# Altium footprint library Toi Library.PcbLib: 740 footprints (part 27 of 47)
Each footprint in its own frame and in the unit in brackets; x right, y up, seen from the top. Pads: shape width x height; smd on the part's side, far side on the other; paste and mask are expansions set on the pad; w line width, h text height; cw(c..) or ccw(c..) is an arc to the next point about the centre after c.
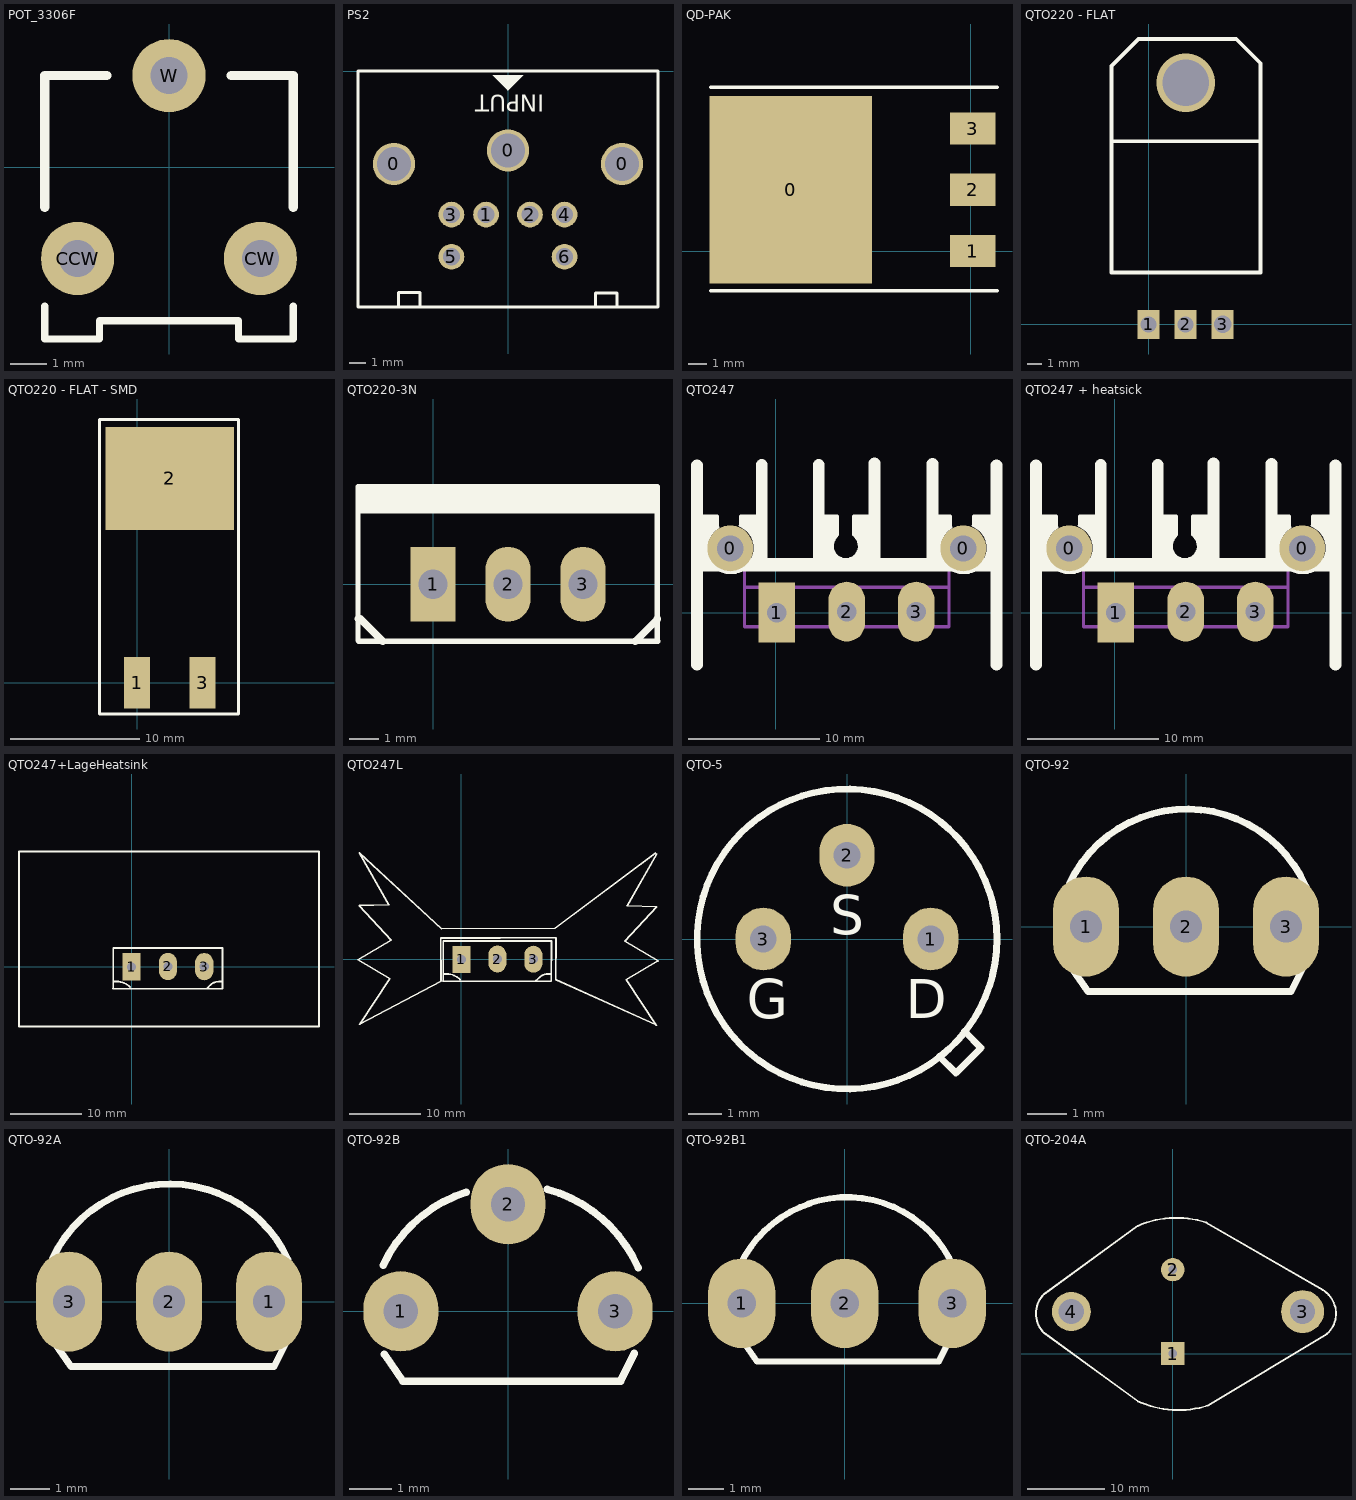
[diagram p26: the footprints below, top view; thin cyan lines are the x and y axes]

## POT_3306F [mm]
pads (3):
  round 2 hole 1.016: CCW(-2.5,-2.5) CW(2.5,-2.5) W(0,2.5)
Top Overlay:
  lines w0.2: -3.4,-3.8 -3.4,-4.7 -1.9,-4.7 -1.9,-4.2 0,-4.2 1.9,-4.2 1.9,-4.7 3.4,-4.7 3.4,-3.8
  lines w0.254: -3.4,-1.1 -3.4,2.5 -1.7,2.5 ; 1.7,2.5 3.4,2.5 3.4,-1.1
3D body "Trimmer, 3306F.step": height 7.62, standoff -3.04, extent -3.405,-4.876 3.405,3.79

## PS2 [mm] "PS2"
height 5.08
pads (9):
  round 2.5 hole 2: 0(-6.76,-5.5) 0(0,-4.7) 0(6.76,-5.5)
  round 1.524 hole 1.016: 1(-1.3,-8.5) 2(1.3,-8.5) 3(-3.35,-8.5) 4(3.35,-8.5) 5(-3.35,-11) 6(3.35,-11)
Top Overlay:
  region: 0.902,-0.254 -0.902,-0.254 -0.013,-1.143 -0.013,-1.168
  lines w0.178: -6.477,-13.894 -6.477,-13.132 -5.207,-13.132 -5.207,-13.894 ; 5.182,-13.919 5.182,-13.157 6.452,-13.157 6.452,-13.919 ; -8.89,-13.97 -8.89,0 8.89,0 8.89,-13.97 -8.89,-13.97
  text "INPUT" at 2.159,-1.397 h1

## QD-PAK [mm] "SMD - D-PAK -For 78xx"
pads (4):
  rect 9x10.41 smd: 0(-10,3.4)
  rect 2.5x1.8 smd: 1(0.102,0) 2(0.102,3.4) 3(0.102,6.8)
Top Overlay:
  lines w0.203: -14.427,-2.21 1.448,-2.21 ; -14.427,9.093 1.448,9.093

## QTO220 - FLAT [mm]
pads (3):
  rect 1.5x2 hole 1.1: 1(0,0) 2(2.54,0)
  rect 1.5x2 hole 1.2: 3(5.08,0)
via 2.54,16.562 diameter 4 hole 3.2
Top Overlay:
  lines w0.254: -2.54,5.861 -2.54,17.71 -0.686,19.564 6.007,19.564 7.671,17.901 7.671,3.562 -2.54,3.562 -2.54,12.554 7.671,12.554
3D body "TO220_NAM.step": height 4.45, standoff -1.79, extent -2.54,-0.19 7.62,19.09

## QTO220 - FLAT - SMD [mm]
pads (3):
  rect 2x4 smd: 1(0,0) 3(5.08,0)
  rect 10x8 smd: 2(2.54,15.875)
Top Overlay:
  lines w0.254: -2.921,-2.413 7.874,-2.413 7.874,20.447 -2.921,20.447 -2.921,-2.413
3D body "TO220_NAM.step": height 4.45, standoff -1.79, extent -2.54,-0.19 7.62,19.09

## QTO220-3N [mil]
pads (3):
  rect 60x100 hole 39: 1(0,0)
  oval 60x100 hole 39: 2(100,0) 3(200,0)
Top Overlay:
  rectangle: -99,94 300,130
  lines w7: 298,107 299,93 ; -100,-75 -100,130 299,130 299,-75 300,-76 -76,-76 -99,-76 -100,-75
  lines w10: -100,-46 -97,-46 -67,-76 ; 270,-76 299,-47 299,-46
3D body "SW3dPS-TO220AB.STEP": height 904.72, standoff -250, extent -119,-64 322.46,120.65

## QTO247 [mil]
pads (5):
  round 137.8 hole 78.74: 0(-136.34,194) 0(563.66,194)
  rect 110x180 hole 59.06: 1(3,1)
  oval 110x180 hole 59.06: 2(213.66,4) 3(422.32,4)
Top Overlay:
  region: 595,290 595,265 615,245 620,245 630,235 630,225 635,220 635,160 660,160 665,165 650,180 650,290
  region: 475,290 525,290 525,255 520,255 500,235 500,225 490,215 490,180 495,175 495,160 475,160
  region: -225,290 -175,290 -175,255 -180,255 -200,235 -200,225 -210,215 -210,180 -205,175 -205,160 -225,160
  region: -105,290 -105,265 -85,245 -80,245 -70,235 -70,225 -65,220 -65,160 -40,160 -35,165 -50,180 -50,290
  region: 140,290 190,290 190,240 170,220 170,180 190,160 140,160
  region: 230,290 290,290 290,150 280,160 230,160 250,180 250,220 230,240
  lines w10: -225,290 -175,290 -175,260 ; -173.69,257.87 ccw(c-135,195) -105.92,262.86 ; -163.31,220 ccw(c-134.15,190.85) -105,220 ; -105,265 -105,290 -55,290 ; 130,290 185,290 185,235 180,230 ; 181.96,229.73 ccw(c210.85,200.85) 239.73,229.73 ; 240,230 235,235 235,290 280,290 ; 475,290 525,290 525,260 ; 526.31,257.87 ccw(c565,195) 594.08,262.86 ; 595,265 595,290 645,290
  lines w35: -236.34,-156 -236.34,444 ; -42,149 -42,445 ; 129,149 129,445 ; 297,148 297,450 ; 471,148 471,448 ; 663.66,-156 663.66,444
  lines w40: -230,145 655,145
Mechanical 1:
  lines w10: -93.43,76.83 520.75,76.83 ; -93.43,-41.28 -93.43,135.89 520.75,135.89 520.75,-41.28 -93.43,-41.28
3D body "User Library-heat sink-1.STEP": height 1355.51, standoff 150, extent -240.79,-200.67 660.79,445
3D body "SW3dPS-TO-247.STEP": height 1060, standoff -360, extent -95,-105 505,75

## QTO247 + heatsick [mil]
pads (5):
  round 137.8 hole 78.74: 0(-136.34,194) 0(563.66,194)
  rect 110x180 hole 59.06: 1(3,1)
  oval 110x180 hole 59.06: 2(213.66,4) 3(422.32,4)
Top Overlay:
  region: 595,290 595,265 615,245 620,245 630,235 630,225 635,220 635,160 660,160 665,165 650,180 650,290
  region: 475,290 525,290 525,255 520,255 500,235 500,225 490,215 490,180 495,175 495,160 475,160
  region: -225,290 -175,290 -175,255 -180,255 -200,235 -200,225 -210,215 -210,180 -205,175 -205,160 -225,160
  region: -105,290 -105,265 -85,245 -80,245 -70,235 -70,225 -65,220 -65,160 -40,160 -35,165 -50,180 -50,290
  region: 140,290 190,290 190,240 170,220 170,180 190,160 140,160
  region: 230,290 290,290 290,150 280,160 230,160 250,180 250,220 230,240
  lines w10: -225,290 -175,290 -175,260 ; -173.69,257.87 ccw(c-135,195) -105.92,262.86 ; -163.31,220 ccw(c-134.15,190.85) -105,220 ; -105,265 -105,290 -55,290 ; 130,290 185,290 185,235 180,230 ; 181.96,229.73 ccw(c210.85,200.85) 239.73,229.73 ; 240,230 235,235 235,290 280,290 ; 475,290 525,290 525,260 ; 526.31,257.87 ccw(c565,195) 594.08,262.86 ; 595,265 595,290 645,290
  lines w35: -236.34,-156 -236.34,444 ; -42,149 -42,445 ; 129,149 129,445 ; 297,148 297,450 ; 471,148 471,448 ; 663.66,-156 663.66,444
  lines w40: -230,145 655,145
Mechanical 1:
  lines w10: -93.43,76.83 520.75,76.83 ; -93.43,-41.28 -93.43,135.89 520.75,135.89 520.75,-41.28 -93.43,-41.28
3D body "User Library-heat sink-1.STEP": height 1206.11, standoff 0.6, extent -252.79,-166.67 648.79,479
3D body "SW3dPS-TO-247.STEP": height 940.6, standoff -479.4, extent -92,-73 508,107

## QTO247+LageHeatsink [mil]
pads (3):
  rect 100x150 hole 50: 1(0,-1)
  oval 100x150 hole 50: 2(200,1) 3(400,0)
Top Overlay:
  lines w10: -102,-121 -101,-120 -101,102 501,102 500,-122 -101,-122 -100,-121 ; -100,-82 -80.43,-82 cw(c-80.43,-184.43) -8,-112 ; 415,-119 ccw(c415,-116.59) 416.71,-118.29 434,-101 cw(c479.87,-146.87) 479.87,-82 499,-82 ; -619.1,-328.6 -619.1,632.9 1031.2,632.9 1031.2,-328.6 -619.1,-328.6
3D body "SW3dPS-aavid 6298b.STEP": height 1100, standoff 100, extent -619,-329 1031,633
3D body "SW3dPS-to-247ad.STEP": height 1006.77, standoff -610.16, extent -108.98,-107 518.98,91.03

## QTO247L [mil]
pads (3):
  rect 100x150 hole 50: 1(0,-1)
  oval 100x150 hole 50: 2(200,1) 3(400,0)
Top Overlay:
  lines w10: -102,-121 -101,-120 -101,102 501,102 500,-122 -101,-122 -100,-121 ; -100,-82 -80.43,-82 cw(c-80.43,-184.43) -8,-112 ; 208,119 526,119 524,-113 1082,-364 ; 214,118 -115,118 -113,-122 -566,-361 -398,-108 -575,-3 -391,106 -568,298 -403,303 -568,592 -111,170 520,172 1078,590 ; 415,-119 ccw(c415,-116.59) 416.71,-118.29 434,-101 cw(c479.87,-146.87) 479.87,-82 499,-82 ; 1084,-367 916,-114 1093,-9 909,100 1086,292 921,297 1086,586
3D body "SW3dPS-to-247ad.STEP": height 1146.77, standoff -470.16, extent -108.98,-117 518.98,81.03
3D body "SW3dPS-aavid 6298b.STEP": height 1100, standoff 100, extent -571,-365 1079,597

## QTO-5 [mil] "TO-5"
height 200
pads (3):
  oval 66x75 hole 32: 1(100,0) 2(0,100) 3(-100,0)
Top Overlay:
  circle w8: c0,0 r179.13
  lines w8: 110,-140 130,-160 160,-130 140,-110
  text "S" at -20,-10 h80
  text "G" at -120,-110 h80
  text "D" at 70,-110 h80

## QTO-92 [mil] "TO-92"
height 200
pads (3):
  oval 66x100 hole 32: 1(-100,0) 2(0,0) 3(100,0)
Top Overlay:
  lines w7: -116.52,43.21 cw(c0.97,-12.43) 119.94,39.97 ; -115.34,-40.24 -98,-65 105,-65 118,-39
3D body "SW3dPS-TO92.STEP": height 245.04, standoff -199.79, extent -108.87,-65.56 108.86,95

## QTO-92A [mil] "TO-92"
height 200
pads (3):
  oval 66x100 hole 32: 1(100,0) 2(0,0) 3(-100,0)
Top Overlay:
  lines w7: -116.52,43.21 cw(c0.97,-12.43) 119.08,41.88 ; -115.34,-40.24 -98,-65 105,-65 118,-39
3D body "SW3dPS-TO92.STEP": height 245.04, standoff -199.79, extent -110,-60.56 107.73,100

## QTO-92B [mil] "TO-92"
height 200
pads (3):
  oval 70x75 hole 32: 1(-100,0) 2(0,100) 3(100,0)
Top Overlay:
  lines w7: -116.52,43.21 cw(c0.97,-12.43) -38.82,111.34 ; -115.34,-40.24 -98,-65 105,-65 118,-39 ; 36.81,113.84 cw(c2.42,-11.53) 121.49,40.65

## QTO-92B1 [mil] "TO-92"
height 200
pads (3):
  oval 75x100 hole 32: 1(-115,0) 2(0,0) 3(120,0)
Top Overlay:
  lines w7: -116.52,43.21 cw(c0.97,-12.43) -38.82,111.34 ; -115.34,-40.24 -98,-65 105,-65 118,-39 ; -40.42,111.21 cw(c2.42,-11.53) 121.49,40.65
3D body "SW3dPS-TO92.STEP": height 385.04, standoff -59.79, extent -112.74,-65.56 105,95

## QTO-204A [mil] "Pin For 2N3055, 2N2955"
pads (4):
  rect 120x120 hole 45: 1(0,0)
  round 120 hole 45: 2(0,430)
  round 220 hole 130: 3(665,215)
  round 200 hole 130: 4(-520,215)
Top Overlay:
  lines w10: -660,105 cw(c-560,205) -660,305 -179.46,654.16 ; -659.88,104.89 -178.69,-244.72 ; -179.53,654.34 cw(c18.37,195.17) 171.59,671.11 ; -178.9,-245.19 ccw(c28.37,209.83) 180.47,-266.47 ; 171.46,670.71 769.34,325.52 ; 180.28,-266.15 789.88,100.13 ccw(c695,205) 769.25,325.36
3D body "SW3dPS-2N3055_New.STEP": height 350.39, standoff -472.44, extent -688,-298.62 857.53,725